# Altium footprint library texas.PCBLIB: 124 footprints (part 4 of 12)
Each footprint in its own frame and in the unit in brackets; x right, y up, seen from the top. Pads: shape width x height; smd on the part's side, far side on the other; paste and mask are expansions set on the pad; w line width, h text height; cw(c..) or ccw(c..) is an arc to the next point about the centre after c.
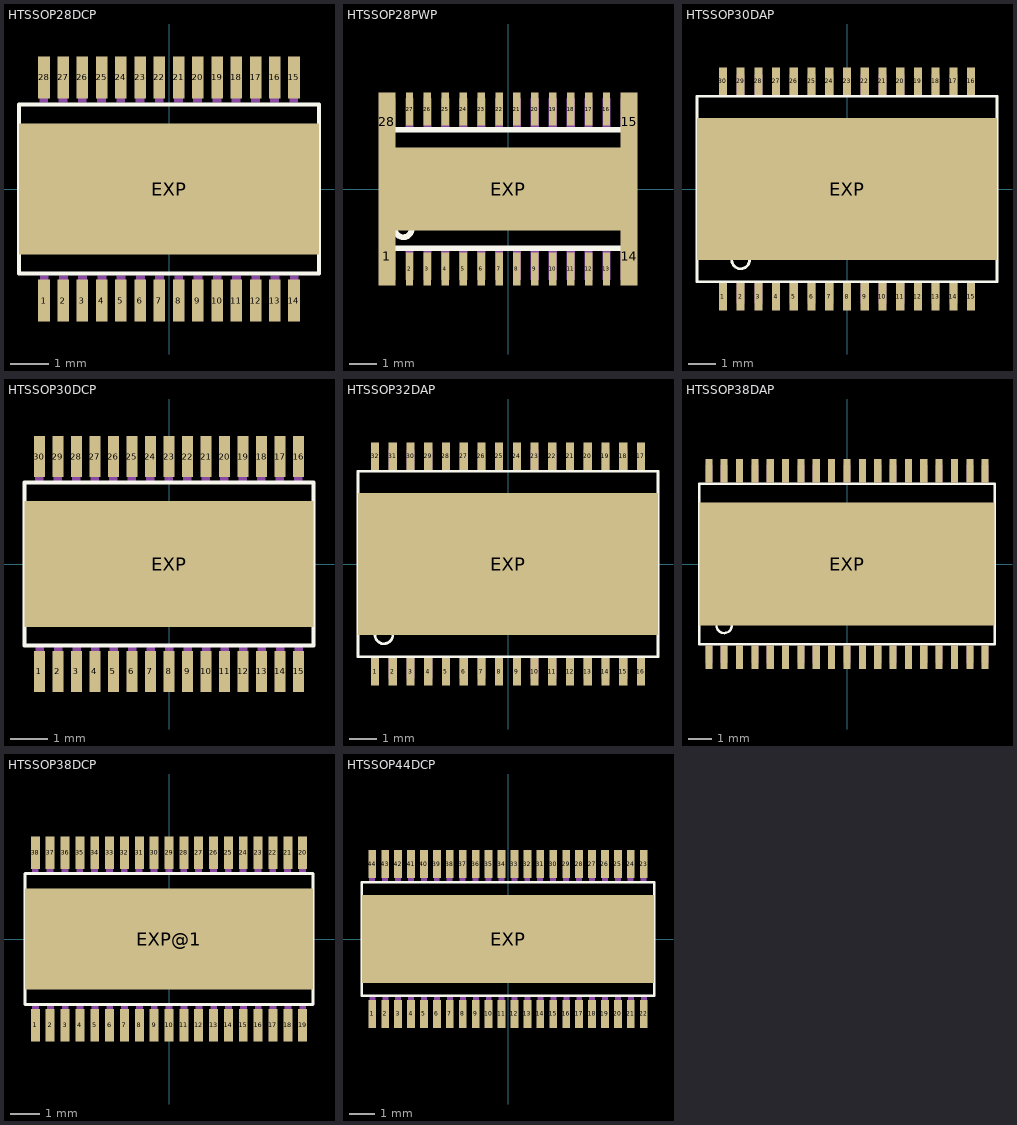
[diagram p3: the footprints below, top view; thin cyan lines are the x and y axes]

## HTSSOP28DCP [mm]
pads (29):
  rect 0.3x1.1 smd: 1(-3.25,-2.9) 2(-2.75,-2.9) 3(-2.25,-2.9) 4(-1.75,-2.9) 5(-1.25,-2.9) 6(-0.75,-2.9) 7(-0.25,-2.9) 8(0.25,-2.9) 9(0.75,-2.9) 10(1.25,-2.9) 11(1.75,-2.9) 12(2.25,-2.9) 13(2.75,-2.9) 14(3.25,-2.9) 15(3.25,2.9) 16(2.75,2.9) 17(2.25,2.9) 18(1.75,2.9) 19(1.25,2.9) 20(0.75,2.9) 21(0.25,2.9) 22(-0.25,2.9) 23(-0.75,2.9) 24(-1.25,2.9) 25(-1.75,2.9) 26(-2.25,2.9) 27(-2.75,2.9) 28(-3.25,2.9)
  rect 7.8x3.4 smd: EXP(0,0)
Top Overlay:
  circle w0.102: c-3.195,-1.35 r0.283
  lines w0.102: -3.9,-2.2 3.9,-2.2 3.9,2.2 -3.9,2.2 -3.9,-2.2
Top Paste:
  rectangle: -3.39,-3.435 -3.11,-2.365
  rectangle: -2.89,-3.435 -2.61,-2.365
  rectangle: -2.39,-3.435 -2.11,-2.365
  rectangle: -1.89,-3.435 -1.61,-2.365
  rectangle: -1.39,-3.435 -1.11,-2.365
  rectangle: -0.89,-3.435 -0.61,-2.365
  rectangle: -0.39,-3.435 -0.11,-2.365
  rectangle: 0.11,-3.435 0.39,-2.365
  rectangle: 0.61,-3.435 0.89,-2.365
  rectangle: 1.11,-3.435 1.39,-2.365
  rectangle: 1.61,-3.435 1.89,-2.365
  rectangle: 2.11,-3.435 2.39,-2.365
  rectangle: 2.61,-3.435 2.89,-2.365
  rectangle: 3.11,-3.435 3.39,-2.365
  region: 3.39,3.435 3.11,3.435 3.11,2.365 3.39,2.365
  region: 2.89,3.435 2.61,3.435 2.61,2.365 2.89,2.365
  region: 2.39,3.435 2.11,3.435 2.11,2.365 2.39,2.365
  region: 1.89,3.435 1.61,3.435 1.61,2.365 1.89,2.365
  region: 1.39,3.435 1.11,3.435 1.11,2.365 1.39,2.365
  region: 0.89,3.435 0.61,3.435 0.61,2.365 0.89,2.365
  region: 0.39,3.435 0.11,3.435 0.11,2.365 0.39,2.365
  region: -0.11,3.435 -0.39,3.435 -0.39,2.365 -0.11,2.365
  region: -0.61,3.435 -0.89,3.435 -0.89,2.365 -0.61,2.365
  region: -1.11,3.435 -1.39,3.435 -1.39,2.365 -1.11,2.365
  region: -1.61,3.435 -1.89,3.435 -1.89,2.365 -1.61,2.365
  region: -2.11,3.435 -2.39,3.435 -2.39,2.365 -2.11,2.365
  region: -2.61,3.435 -2.89,3.435 -2.89,2.365 -2.61,2.365
  region: -3.11,3.435 -3.39,3.435 -3.39,2.365 -3.11,2.365
Top Solder:
  rectangle: -3.405,-3.455 -3.095,-2.345
  rectangle: -2.905,-3.455 -2.595,-2.345
  rectangle: -2.405,-3.455 -2.095,-2.345
  rectangle: -1.905,-3.455 -1.595,-2.345
  rectangle: -1.405,-3.455 -1.095,-2.345
  rectangle: -0.905,-3.455 -0.595,-2.345
  rectangle: -0.405,-3.455 -0.095,-2.345
  rectangle: 0.095,-3.455 0.405,-2.345
  rectangle: 0.595,-3.455 0.905,-2.345
  rectangle: 1.095,-3.455 1.405,-2.345
  rectangle: 1.595,-3.455 1.905,-2.345
  rectangle: 2.095,-3.455 2.405,-2.345
  rectangle: 2.595,-3.455 2.905,-2.345
  rectangle: 3.095,-3.455 3.405,-2.345
  region: 3.405,3.455 3.095,3.455 3.095,2.345 3.405,2.345
  region: 2.905,3.455 2.595,3.455 2.595,2.345 2.905,2.345
  region: 2.405,3.455 2.095,3.455 2.095,2.345 2.405,2.345
  region: 1.905,3.455 1.595,3.455 1.595,2.345 1.905,2.345
  region: 1.405,3.455 1.095,3.455 1.095,2.345 1.405,2.345
  region: 0.905,3.455 0.595,3.455 0.595,2.345 0.905,2.345
  region: 0.405,3.455 0.095,3.455 0.095,2.345 0.405,2.345
  region: -0.095,3.455 -0.405,3.455 -0.405,2.345 -0.095,2.345
  region: -0.595,3.455 -0.905,3.455 -0.905,2.345 -0.595,2.345
  region: -1.095,3.455 -1.405,3.455 -1.405,2.345 -1.095,2.345
  region: -1.595,3.455 -1.905,3.455 -1.905,2.345 -1.595,2.345
  region: -2.095,3.455 -2.405,3.455 -2.405,2.345 -2.095,2.345
  region: -2.595,3.455 -2.905,3.455 -2.905,2.345 -2.595,2.345
  region: -3.095,3.455 -3.405,3.455 -3.405,2.345 -3.095,2.345
  rectangle: -3.895,-1.7 3.895,1.7
Mechanical 16:
  rectangle: -3.36,-3.3 -3.13,-2.245
  rectangle: -2.86,-3.3 -2.63,-2.245
  rectangle: -2.36,-3.3 -2.13,-2.245
  rectangle: -1.86,-3.3 -1.63,-2.245
  rectangle: -1.36,-3.3 -1.13,-2.245
  rectangle: -0.86,-3.3 -0.63,-2.245
  rectangle: -0.36,-3.3 -0.13,-2.245
  rectangle: 0.14,-3.3 0.37,-2.245
  rectangle: 0.64,-3.3 0.87,-2.245
  rectangle: 1.14,-3.3 1.37,-2.245
  rectangle: 1.64,-3.3 1.87,-2.245
  rectangle: 2.14,-3.3 2.37,-2.245
  rectangle: 2.64,-3.3 2.87,-2.245
  rectangle: 3.14,-3.3 3.37,-2.245
  region: 3.36,3.3 3.13,3.3 3.13,2.245 3.36,2.245
  region: 2.86,3.3 2.63,3.3 2.63,2.245 2.86,2.245
  region: 2.36,3.3 2.13,3.3 2.13,2.245 2.36,2.245
  region: 1.86,3.3 1.63,3.3 1.63,2.245 1.86,2.245
  region: 1.36,3.3 1.13,3.3 1.13,2.245 1.36,2.245
  region: 0.86,3.3 0.63,3.3 0.63,2.245 0.86,2.245
  region: 0.36,3.3 0.13,3.3 0.13,2.245 0.36,2.245
  region: -0.14,3.3 -0.37,3.3 -0.37,2.245 -0.14,2.245
  region: -0.64,3.3 -0.87,3.3 -0.87,2.245 -0.64,2.245
  region: -1.14,3.3 -1.37,3.3 -1.37,2.245 -1.14,2.245
  region: -1.64,3.3 -1.87,3.3 -1.87,2.245 -1.64,2.245
  region: -2.14,3.3 -2.37,3.3 -2.37,2.245 -2.14,2.245
  region: -2.64,3.3 -2.87,3.3 -2.87,2.245 -2.64,2.245
  region: -3.14,3.3 -3.37,3.3 -3.37,2.245 -3.14,2.245

## HTSSOP28PWP [mm]
pads (29):
  rect 0.61x2.1 smd: 1(-4.395,-2.45) 14(4.395,-2.45) 15(4.395,2.45) 28(-4.395,2.45)
  rect 0.27x1.2 smd: 2(-3.575,-2.9) 3(-2.925,-2.9) 4(-2.275,-2.9) 5(-1.625,-2.9) 6(-0.975,-2.9) 7(-0.325,-2.9) 8(0.325,-2.9) 9(0.975,-2.9) 10(1.625,-2.9) 11(2.275,-2.9) 12(2.925,-2.9) 13(3.575,-2.9) 16(3.575,2.9) 17(2.925,2.9) 18(2.275,2.9) 19(1.625,2.9) 20(0.975,2.9) 21(0.325,2.9) 22(-0.325,2.9) 23(-0.975,2.9) 24(-1.625,2.9) 25(-2.275,2.9) 26(-2.925,2.9) 27(-3.575,2.9)
  rect 9.4x3 smd: EXP(0,0)
Top Overlay:
  circle w0.203: c-3.8,-1.45 r0.3
  lines w0.203: -4.5,-2.15 4.5,-2.15 4.5,2.15 -4.5,2.15 -4.5,-2.15
Top Paste:
  rectangle: -4.35,-3.48 -4.1,-2.31
  rectangle: -3.7,-3.48 -3.45,-2.31
  rectangle: -3.05,-3.48 -2.8,-2.31
  rectangle: -2.4,-3.48 -2.15,-2.31
  rectangle: -1.75,-3.48 -1.5,-2.31
  rectangle: -1.1,-3.48 -0.85,-2.31
  rectangle: -0.45,-3.48 -0.2,-2.31
  rectangle: 0.2,-3.48 0.45,-2.31
  rectangle: 0.85,-3.48 1.1,-2.31
  rectangle: 1.5,-3.48 1.75,-2.31
  rectangle: 2.15,-3.48 2.4,-2.31
  rectangle: 2.8,-3.48 3.05,-2.31
  rectangle: 3.45,-3.48 3.7,-2.31
  rectangle: 4.1,-3.48 4.35,-2.31
  region: 4.35,3.48 4.1,3.48 4.1,2.31 4.35,2.31
  region: 3.7,3.48 3.45,3.48 3.45,2.31 3.7,2.31
  region: 3.05,3.48 2.8,3.48 2.8,2.31 3.05,2.31
  region: 2.4,3.48 2.15,3.48 2.15,2.31 2.4,2.31
  region: 1.75,3.48 1.5,3.48 1.5,2.31 1.75,2.31
  region: 1.1,3.48 0.85,3.48 0.85,2.31 1.1,2.31
  region: 0.45,3.48 0.2,3.48 0.2,2.31 0.45,2.31
  region: -0.2,3.48 -0.45,3.48 -0.45,2.31 -0.2,2.31
  region: -0.85,3.48 -1.1,3.48 -1.1,2.31 -0.85,2.31
  region: -1.5,3.48 -1.75,3.48 -1.75,2.31 -1.5,2.31
  region: -2.15,3.48 -2.4,3.48 -2.4,2.31 -2.15,2.31
  region: -2.8,3.48 -3.05,3.48 -3.05,2.31 -2.8,2.31
  region: -3.45,3.48 -3.7,3.48 -3.7,2.31 -3.45,2.31
  region: -4.1,3.48 -4.35,3.48 -4.35,2.31 -4.1,2.31
  rectangle: -3.1,-1 3.1,1
Top Solder:
  rectangle: -4.36,-3.5 -4.09,-2.3
  rectangle: -3.71,-3.5 -3.44,-2.3
  rectangle: -3.06,-3.5 -2.79,-2.3
  rectangle: -2.41,-3.5 -2.14,-2.3
  rectangle: -1.76,-3.5 -1.49,-2.3
  rectangle: -1.11,-3.5 -0.84,-2.3
  rectangle: -0.46,-3.5 -0.19,-2.3
  rectangle: 0.19,-3.5 0.46,-2.3
  rectangle: 0.84,-3.5 1.11,-2.3
  rectangle: 1.49,-3.5 1.76,-2.3
  rectangle: 2.14,-3.5 2.41,-2.3
  rectangle: 4.09,-3.5 4.36,-2.3
  region: 4.36,3.5 4.09,3.5 4.09,2.3 4.36,2.3
  region: 2.41,3.5 2.14,3.5 2.14,2.3 2.41,2.3
  region: 1.76,3.5 1.49,3.5 1.49,2.3 1.76,2.3
  region: 1.11,3.5 0.84,3.5 0.84,2.3 1.11,2.3
  region: 0.46,3.5 0.19,3.5 0.19,2.3 0.46,2.3
  region: -0.19,3.5 -0.46,3.5 -0.46,2.3 -0.19,2.3
  region: -0.84,3.5 -1.11,3.5 -1.11,2.3 -0.84,2.3
  region: -1.49,3.5 -1.76,3.5 -1.76,2.3 -1.49,2.3
  region: -2.14,3.5 -2.41,3.5 -2.41,2.3 -2.14,2.3
  region: -2.79,3.5 -3.06,3.5 -3.06,2.3 -2.79,2.3
  region: -3.44,3.5 -3.71,3.5 -3.71,2.3 -3.44,2.3
  region: -4.09,3.5 -4.36,3.5 -4.36,2.3 -4.09,2.3
  rectangle: -3.19,-1.1 3.19,1.1
  region: 3.06,3.5 2.79,3.5 2.79,2.3 3.06,2.3
  rectangle: 2.79,-3.5 3.06,-2.3
  region: 3.71,3.5 3.44,3.5 3.44,2.3 3.71,2.3
  rectangle: 3.44,-3.5 3.71,-2.3
Mechanical 16:
  rectangle: -4.375,-3.3 -4.075,-2.2
  rectangle: -3.725,-3.3 -3.425,-2.2
  rectangle: -3.075,-3.3 -2.775,-2.2
  rectangle: -2.425,-3.3 -2.125,-2.2
  rectangle: -1.775,-3.3 -1.475,-2.2
  rectangle: -1.125,-3.3 -0.825,-2.2
  rectangle: -0.475,-3.3 -0.175,-2.2
  rectangle: 0.175,-3.3 0.475,-2.2
  rectangle: 0.825,-3.3 1.125,-2.2
  rectangle: 1.475,-3.3 1.775,-2.2
  rectangle: 2.125,-3.3 2.425,-2.2
  rectangle: 4.075,-3.3 4.375,-2.2
  region: 4.375,3.3 4.075,3.3 4.075,2.2 4.375,2.2
  region: -4.075,3.3 -4.375,3.3 -4.375,2.2 -4.075,2.2
  rectangle: 2.775,-3.3 3.075,-2.2
  rectangle: 3.425,-3.3 3.725,-2.2
  region: 3.725,3.3 3.425,3.3 3.425,2.2 3.725,2.2
  region: 3.075,3.3 2.775,3.3 2.775,2.2 3.075,2.2
  region: 2.425,3.3 2.125,3.3 2.125,2.2 2.425,2.2
  region: 1.775,3.3 1.475,3.3 1.475,2.2 1.775,2.2
  region: 1.125,3.3 0.825,3.3 0.825,2.2 1.125,2.2
  region: 0.475,3.3 0.175,3.3 0.175,2.2 0.475,2.2
  region: -0.175,3.3 -0.475,3.3 -0.475,2.2 -0.175,2.2
  region: -0.825,3.3 -1.125,3.3 -1.125,2.2 -0.825,2.2
  region: -1.475,3.3 -1.775,3.3 -1.775,2.2 -1.475,2.2
  region: -2.125,3.3 -2.425,3.3 -2.425,2.2 -2.125,2.2
  region: -2.775,3.3 -3.075,3.3 -3.075,2.2 -2.775,2.2
  region: -3.425,3.3 -3.725,3.3 -3.725,2.2 -3.425,2.2

## HTSSOP30DAP [mm]
pads (31):
  rect 0.3x1 smd: 1(-4.55,-3.95) 2(-3.9,-3.95) 3(-3.25,-3.95) 4(-2.6,-3.95) 5(-1.95,-3.95) 6(-1.3,-3.95) 7(-0.65,-3.95) 8(0,-3.95) 9(0.65,-3.95) 10(1.3,-3.95) 11(1.95,-3.95) 12(2.6,-3.95) 13(3.25,-3.95) 14(3.9,-3.95) 15(4.55,-3.95) 16(4.55,3.95) 17(3.9,3.95) 18(3.25,3.95) 19(2.6,3.95) 20(1.95,3.95) 21(1.3,3.95) 22(0.65,3.95) 23(0,3.95) 24(-0.65,3.95) 25(-1.3,3.95) 26(-1.95,3.95) 27(-2.6,3.95) 28(-3.25,3.95) 29(-3.9,3.95) 30(-4.55,3.95)
  rect 11x5.2 smd: EXP(0,0)
Top Overlay:
  circle w0.102: c-3.9,-2.6 r0.325
  lines w0.102: -5.5,-3.4 5.5,-3.4 5.5,3.4 -5.5,3.4 -5.5,-3.4
Top Solder:
  rectangle: -4.71,-4.46 -4.39,-3.44
  rectangle: -4.695,-4.445 -4.405,-3.455
  rectangle: -4.06,-4.46 -3.74,-3.44
  rectangle: -4.045,-4.445 -3.755,-3.455
  rectangle: -3.41,-4.46 -3.09,-3.44
  rectangle: -3.395,-4.445 -3.105,-3.455
  rectangle: -2.76,-4.46 -2.44,-3.44
  rectangle: -2.745,-4.445 -2.455,-3.455
  rectangle: -2.11,-4.46 -1.79,-3.44
  rectangle: -2.095,-4.445 -1.805,-3.455
  rectangle: -1.46,-4.46 -1.14,-3.44
  rectangle: -1.445,-4.445 -1.155,-3.455
  rectangle: -0.81,-4.46 -0.49,-3.44
  rectangle: -0.795,-4.445 -0.505,-3.455
  rectangle: -0.16,-4.46 0.16,-3.44
  rectangle: -0.145,-4.445 0.145,-3.455
  rectangle: 0.49,-4.46 0.81,-3.44
  rectangle: 0.505,-4.445 0.795,-3.455
  rectangle: 1.14,-4.46 1.46,-3.44
  rectangle: 1.155,-4.445 1.445,-3.455
  rectangle: 1.79,-4.46 2.11,-3.44
  rectangle: 1.805,-4.445 2.095,-3.455
  rectangle: 2.44,-4.46 2.76,-3.44
  rectangle: 2.455,-4.445 2.745,-3.455
  rectangle: 3.09,-4.46 3.41,-3.44
  rectangle: 3.105,-4.445 3.395,-3.455
  rectangle: 3.74,-4.46 4.06,-3.44
  rectangle: 3.755,-4.445 4.045,-3.455
  rectangle: 4.39,-4.46 4.71,-3.44
  rectangle: 4.405,-4.445 4.695,-3.455
  region: 4.71,4.46 4.39,4.46 4.39,3.44 4.71,3.44
  region: 4.695,4.445 4.405,4.445 4.405,3.455 4.695,3.455
  region: 4.06,4.46 3.74,4.46 3.74,3.44 4.06,3.44
  region: 4.045,4.445 3.755,4.445 3.755,3.455 4.045,3.455
  region: 3.41,4.46 3.09,4.46 3.09,3.44 3.41,3.44
  region: 3.395,4.445 3.105,4.445 3.105,3.455 3.395,3.455
  region: 2.76,4.46 2.44,4.46 2.44,3.44 2.76,3.44
  region: 2.745,4.445 2.455,4.445 2.455,3.455 2.745,3.455
  region: 2.11,4.46 1.79,4.46 1.79,3.44 2.11,3.44
  region: 2.095,4.445 1.805,4.445 1.805,3.455 2.095,3.455
  region: 1.46,4.46 1.14,4.46 1.14,3.44 1.46,3.44
  region: 1.445,4.445 1.155,4.445 1.155,3.455 1.445,3.455
  region: 0.81,4.46 0.49,4.46 0.49,3.44 0.81,3.44
  region: 0.795,4.445 0.505,4.445 0.505,3.455 0.795,3.455
  region: 0.16,4.46 -0.16,4.46 -0.16,3.44 0.16,3.44
  region: 0.145,4.445 -0.145,4.445 -0.145,3.455 0.145,3.455
  region: -0.49,4.46 -0.81,4.46 -0.81,3.44 -0.49,3.44
  region: -0.505,4.445 -0.795,4.445 -0.795,3.455 -0.505,3.455
  region: -1.14,4.46 -1.46,4.46 -1.46,3.44 -1.14,3.44
  region: -1.155,4.445 -1.445,4.445 -1.445,3.455 -1.155,3.455
  region: -1.79,4.46 -2.11,4.46 -2.11,3.44 -1.79,3.44
  region: -1.805,4.445 -2.095,4.445 -2.095,3.455 -1.805,3.455
  region: -2.44,4.46 -2.76,4.46 -2.76,3.44 -2.44,3.44
  region: -2.455,4.445 -2.745,4.445 -2.745,3.455 -2.455,3.455
  region: -3.09,4.46 -3.41,4.46 -3.41,3.44 -3.09,3.44
  region: -3.105,4.445 -3.395,4.445 -3.395,3.455 -3.105,3.455
  region: -3.74,4.46 -4.06,4.46 -4.06,3.44 -3.74,3.44
  region: -3.755,4.445 -4.045,4.445 -4.045,3.455 -3.755,3.455
  region: -4.39,4.46 -4.71,4.46 -4.71,3.44 -4.39,3.44
  region: -4.405,4.445 -4.695,4.445 -4.695,3.455 -4.405,3.455
  rectangle: -5.5,-2.6 5.5,2.6
Mechanical 16:
  rectangle: -4.7,-4.2 -4.4,-3.45
  rectangle: -4.05,-4.2 -3.75,-3.45
  rectangle: -3.4,-4.2 -3.1,-3.45
  rectangle: -2.75,-4.2 -2.45,-3.45
  rectangle: -2.1,-4.2 -1.8,-3.45
  rectangle: -1.45,-4.2 -1.15,-3.45
  rectangle: -0.8,-4.2 -0.5,-3.45
  rectangle: -0.15,-4.2 0.15,-3.45
  rectangle: 0.5,-4.2 0.8,-3.45
  rectangle: 1.15,-4.2 1.45,-3.45
  rectangle: 1.8,-4.2 2.1,-3.45
  rectangle: 2.45,-4.2 2.75,-3.45
  rectangle: 3.1,-4.2 3.4,-3.45
  rectangle: 3.75,-4.2 4.05,-3.45
  rectangle: 4.4,-4.2 4.7,-3.45
  region: 4.7,4.2 4.4,4.2 4.4,3.45 4.7,3.45
  region: 4.05,4.2 3.75,4.2 3.75,3.45 4.05,3.45
  region: 3.4,4.2 3.1,4.2 3.1,3.45 3.4,3.45
  region: 2.75,4.2 2.45,4.2 2.45,3.45 2.75,3.45
  region: 2.1,4.2 1.8,4.2 1.8,3.45 2.1,3.45
  region: 1.45,4.2 1.15,4.2 1.15,3.45 1.45,3.45
  region: 0.8,4.2 0.5,4.2 0.5,3.45 0.8,3.45
  region: 0.15,4.2 -0.15,4.2 -0.15,3.45 0.15,3.45
  region: -0.5,4.2 -0.8,4.2 -0.8,3.45 -0.5,3.45
  region: -1.15,4.2 -1.45,4.2 -1.45,3.45 -1.15,3.45
  region: -1.8,4.2 -2.1,4.2 -2.1,3.45 -1.8,3.45
  region: -2.45,4.2 -2.75,4.2 -2.75,3.45 -2.45,3.45
  region: -3.1,4.2 -3.4,4.2 -3.4,3.45 -3.1,3.45
  region: -3.75,4.2 -4.05,4.2 -4.05,3.45 -3.75,3.45
  region: -4.4,4.2 -4.7,4.2 -4.7,3.45 -4.4,3.45

## HTSSOP30DCP [mm]
pads (31):
  rect 0.3x1.1 smd: 1(-3.5,-2.9) 2(-3,-2.9) 3(-2.5,-2.9) 4(-2,-2.9) 5(-1.5,-2.9) 6(-1,-2.9) 7(-0.5,-2.9) 8(0,-2.9) 9(0.5,-2.9) 10(1,-2.9) 11(1.5,-2.9) 12(2,-2.9) 13(2.5,-2.9) 14(3,-2.9) 15(3.5,-2.9) 16(3.5,2.9) 17(3,2.9) 18(2.5,2.9) 19(2,2.9) 20(1.5,2.9) 21(1,2.9) 22(0.5,2.9) 23(0,2.9) 24(-0.5,2.9) 25(-1,2.9) 26(-1.5,2.9) 27(-2,2.9) 28(-2.5,2.9) 29(-3,2.9) 30(-3.5,2.9)
  rect 7.8x3.4 smd: EXP(0,0)
Top Overlay:
  circle w0.102: c-3.445,-1.35 r0.283
  lines w0.102: -3.9,-2.2 3.9,-2.2 3.9,2.2 -3.9,2.2 -3.9,-2.2
Top Paste:
  rectangle: -3.64,-3.435 -3.36,-2.365
  rectangle: -3.14,-3.435 -2.86,-2.365
  rectangle: -2.64,-3.435 -2.36,-2.365
  rectangle: -2.14,-3.435 -1.86,-2.365
  rectangle: -1.64,-3.435 -1.36,-2.365
  rectangle: -1.14,-3.435 -0.86,-2.365
  rectangle: -0.64,-3.435 -0.36,-2.365
  rectangle: -0.14,-3.435 0.14,-2.365
  rectangle: 0.36,-3.435 0.64,-2.365
  rectangle: 0.86,-3.435 1.14,-2.365
  rectangle: 1.36,-3.435 1.64,-2.365
  rectangle: 1.86,-3.435 2.14,-2.365
  rectangle: 2.36,-3.435 2.64,-2.365
  rectangle: 2.86,-3.435 3.14,-2.365
  rectangle: 3.36,-3.435 3.64,-2.365
  region: 3.64,3.435 3.36,3.435 3.36,2.365 3.64,2.365
  region: 3.14,3.435 2.86,3.435 2.86,2.365 3.14,2.365
  region: 2.64,3.435 2.36,3.435 2.36,2.365 2.64,2.365
  region: 2.14,3.435 1.86,3.435 1.86,2.365 2.14,2.365
  region: 1.64,3.435 1.36,3.435 1.36,2.365 1.64,2.365
  region: 1.14,3.435 0.86,3.435 0.86,2.365 1.14,2.365
  region: 0.64,3.435 0.36,3.435 0.36,2.365 0.64,2.365
  region: 0.14,3.435 -0.14,3.435 -0.14,2.365 0.14,2.365
  region: -0.36,3.435 -0.64,3.435 -0.64,2.365 -0.36,2.365
  region: -0.86,3.435 -1.14,3.435 -1.14,2.365 -0.86,2.365
  region: -1.36,3.435 -1.64,3.435 -1.64,2.365 -1.36,2.365
  region: -1.86,3.435 -2.14,3.435 -2.14,2.365 -1.86,2.365
  region: -2.36,3.435 -2.64,3.435 -2.64,2.365 -2.36,2.365
  region: -2.86,3.435 -3.14,3.435 -3.14,2.365 -2.86,2.365
  region: -3.36,3.435 -3.64,3.435 -3.64,2.365 -3.36,2.365
Top Solder:
  rectangle: -3.655,-3.455 -3.345,-2.345
  rectangle: -3.155,-3.455 -2.845,-2.345
  rectangle: -2.655,-3.455 -2.345,-2.345
  rectangle: -2.155,-3.455 -1.845,-2.345
  rectangle: -1.655,-3.455 -1.345,-2.345
  rectangle: -1.155,-3.455 -0.845,-2.345
  rectangle: -0.655,-3.455 -0.345,-2.345
  rectangle: -0.155,-3.455 0.155,-2.345
  rectangle: 0.345,-3.455 0.655,-2.345
  rectangle: 0.845,-3.455 1.155,-2.345
  rectangle: 1.345,-3.455 1.655,-2.345
  rectangle: 1.845,-3.455 2.155,-2.345
  rectangle: 2.345,-3.455 2.655,-2.345
  rectangle: 2.845,-3.455 3.155,-2.345
  rectangle: 3.345,-3.455 3.655,-2.345
  region: 3.655,3.455 3.345,3.455 3.345,2.345 3.655,2.345
  region: 3.155,3.455 2.845,3.455 2.845,2.345 3.155,2.345
  region: 2.655,3.455 2.345,3.455 2.345,2.345 2.655,2.345
  region: 2.155,3.455 1.845,3.455 1.845,2.345 2.155,2.345
  region: 1.655,3.455 1.345,3.455 1.345,2.345 1.655,2.345
  region: 1.155,3.455 0.845,3.455 0.845,2.345 1.155,2.345
  region: 0.655,3.455 0.345,3.455 0.345,2.345 0.655,2.345
  region: 0.155,3.455 -0.155,3.455 -0.155,2.345 0.155,2.345
  region: -0.345,3.455 -0.655,3.455 -0.655,2.345 -0.345,2.345
  region: -0.845,3.455 -1.155,3.455 -1.155,2.345 -0.845,2.345
  region: -1.345,3.455 -1.655,3.455 -1.655,2.345 -1.345,2.345
  region: -1.845,3.455 -2.155,3.455 -2.155,2.345 -1.845,2.345
  region: -2.345,3.455 -2.655,3.455 -2.655,2.345 -2.345,2.345
  rectangle: -3.895,-1.7 3.895,1.7
  region: -2.845,3.455 -3.155,3.455 -3.155,2.345 -2.845,2.345
  region: -3.345,3.455 -3.655,3.455 -3.655,2.345 -3.345,2.345
Mechanical 16:
  rectangle: -3.61,-3.3 -3.38,-2.245
  rectangle: -3.11,-3.3 -2.88,-2.245
  rectangle: -2.61,-3.3 -2.38,-2.245
  rectangle: -2.11,-3.3 -1.88,-2.245
  rectangle: -1.61,-3.3 -1.38,-2.245
  rectangle: -1.11,-3.3 -0.88,-2.245
  rectangle: -0.61,-3.3 -0.38,-2.245
  rectangle: -0.11,-3.3 0.12,-2.245
  rectangle: 0.39,-3.3 0.62,-2.245
  rectangle: 0.89,-3.3 1.12,-2.245
  rectangle: 1.39,-3.3 1.62,-2.245
  rectangle: 1.89,-3.3 2.12,-2.245
  rectangle: 2.39,-3.3 2.62,-2.245
  rectangle: 2.89,-3.3 3.12,-2.245
  rectangle: 3.39,-3.3 3.62,-2.245
  region: 3.61,3.3 3.38,3.3 3.38,2.245 3.61,2.245
  region: 3.11,3.3 2.88,3.3 2.88,2.245 3.11,2.245
  region: 2.61,3.3 2.38,3.3 2.38,2.245 2.61,2.245
  region: 2.11,3.3 1.88,3.3 1.88,2.245 2.11,2.245
  region: 1.61,3.3 1.38,3.3 1.38,2.245 1.61,2.245
  region: 1.11,3.3 0.88,3.3 0.88,2.245 1.11,2.245
  region: 0.61,3.3 0.38,3.3 0.38,2.245 0.61,2.245
  region: 0.11,3.3 -0.12,3.3 -0.12,2.245 0.11,2.245
  region: -0.39,3.3 -0.62,3.3 -0.62,2.245 -0.39,2.245
  region: -0.89,3.3 -1.12,3.3 -1.12,2.245 -0.89,2.245
  region: -1.39,3.3 -1.62,3.3 -1.62,2.245 -1.39,2.245
  region: -1.89,3.3 -2.12,3.3 -2.12,2.245 -1.89,2.245
  region: -2.39,3.3 -2.62,3.3 -2.62,2.245 -2.39,2.245
  region: -2.89,3.3 -3.12,3.3 -3.12,2.245 -2.89,2.245
  region: -3.39,3.3 -3.62,3.3 -3.62,2.245 -3.39,2.245
